# Altium footprint library pcb_ConnectorGeneral.PcbLib: 111 footprints (part 5 of 7)
Each footprint in its own frame and in the unit in brackets; x right, y up, seen from the top. Pads: shape width x height; smd on the part's side, far side on the other; paste and mask are expansions set on the pad; w line width, h text height; cw(c..) or ccw(c..) is an arc to the next point about the centre after c.
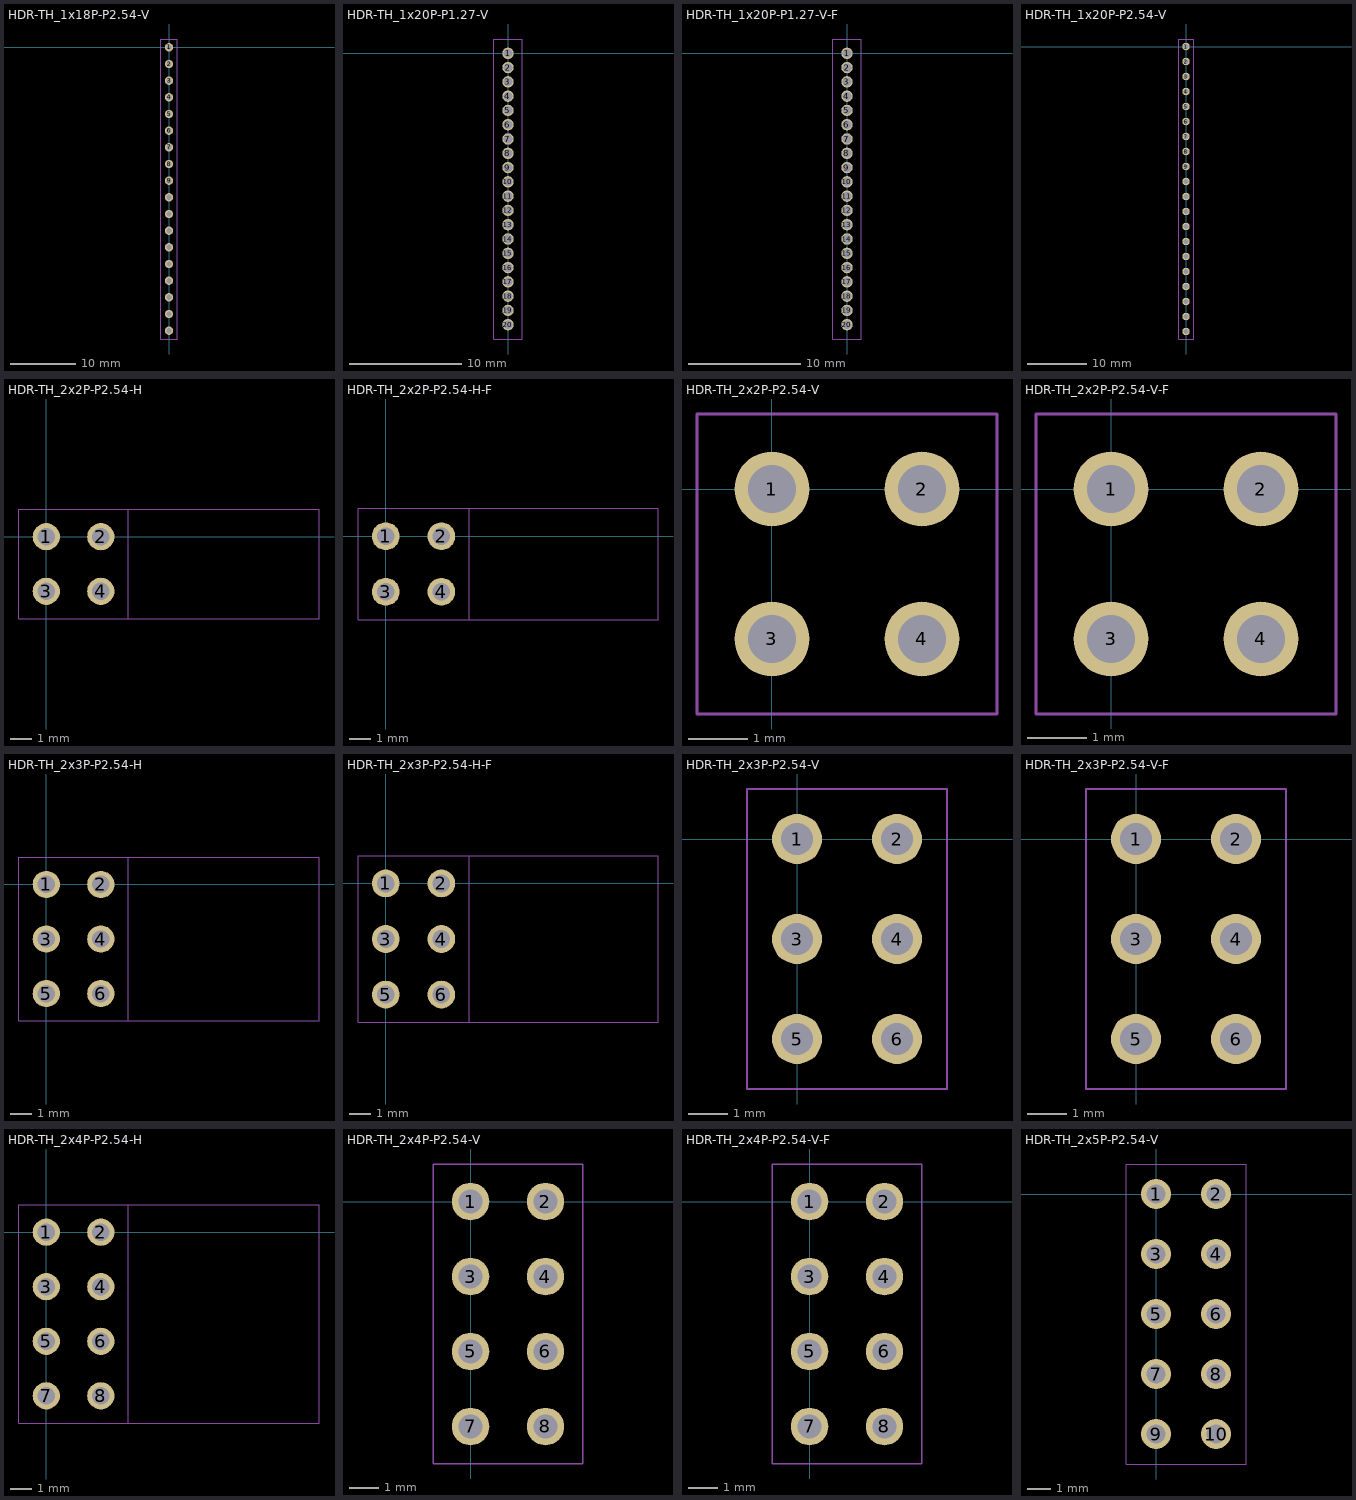
[diagram p4: the footprints below, top view; thin cyan lines are the x and y axes]

## HDR-TH_1x18P-P2.54-V [mil]
height 169.29
pads (18):
  round 50 hole 32: 1(0,0) 2(0,-100) 3(0,-200) 4(0,-300) 5(0,-400) 6(0,-500) 7(0,-600) 8(0,-700) 9(0,-800) 10(0,-900) 11(0,-1000) 12(0,-1100) 13(0,-1200) 14(0,-1300) 15(0,-1400) 16(0,-1500) 17(0,-1600) 18(0,-1700)
Mechanical 13:
  lines w2: -50,-1750 50,-1750 50,50 -50,50 -50,-1750
Mechanical 14:
  lines w2: -50,-1750 50,-1750 50,50 -50,50 -50,-1750
Mechanical 16:
  text ".Designator" at 0,0 h39.37
3D body "pin_header_aw140-eg-g18d.stp": height 322.83, standoff -118.11, extent -49.19,-1750 49.18,50

## HDR-TH_1x20P-P1.27-V [mil]
height 169.29
pads (20):
  round 40 hole 30: 1(0,0) 2(0,-50) 3(0,-100) 4(0,-150) 5(0,-200) 6(0,-250) 7(0,-300) 8(0,-350) 9(0,-400) 10(0,-450) 11(0,-500) 12(0,-550) 13(0,-600) 14(0,-650) 15(0,-700) 16(0,-750) 17(0,-800) 18(0,-850) 19(-0.01,-900) 20(-0.01,-950)
Mechanical 13:
  lines w2: -50,-1000 -50,50 50,50 50,-1000 -50,-1000
Mechanical 14:
  lines w2: -50,-1000 -50,50 50,50 50,-1000 -50,-1000
Mechanical 16:
  text ".Designator" at 0,0 h39.37
3D body "pin_header_a-sl127-eg-g20d.stp": height 210.24, standoff -102.36, extent -49.65,-975 48.77,25

## HDR-TH_1x20P-P1.27-V-F [mil]
height 169.29
pads (20):
  round 40 hole 30: 1(0,0) 2(0,-50) 3(0,-100) 4(0,-150) 5(0,-200) 6(0,-250) 7(0,-300) 8(0,-350) 9(0,-400) 10(0,-450) 11(0,-500) 12(0,-550) 13(0,-600) 14(0,-650) 15(0,-700) 16(0,-750) 17(0,-800) 18(0,-850) 19(-0.01,-900) 20(-0.01,-950)
Mechanical 13:
  lines w2: -50,-1000 -50,50 50,50 50,-1000 -50,-1000
Mechanical 14:
  lines w2: -50,-1000 -50,50 50,50 50,-1000 -50,-1000
Mechanical 16:
  text ".Designator" at 0,0 h39.37
3D body "female_header_a-bl127-eg-g20d.stp": height 133.86, standoff -94.49, extent -35.87,-982.87 34.99,32.88

## HDR-TH_1x20P-P2.54-V [mil]
height 169.29
pads (20):
  round 50 hole 32: 1(0,0) 2(0,-100) 3(0,-200) 4(0,-300) 5(0,-400) 6(0,-500) 7(0,-600) 8(0,-700) 9(0,-800) 10(0,-900) 11(0,-1000) 12(0,-1100) 13(0,-1200) 14(0,-1300) 15(0,-1400) 16(0,-1500) 17(0,-1600) 18(0,-1700) 19(0,-1800) 20(0,-1900)
Mechanical 13:
  lines w2: -50,-1950 50,-1950 50,50 -50,50 -50,-1950
Mechanical 14:
  lines w2: -50,-1950 50,-1950 50,50 -50,50 -50,-1950
Mechanical 16:
  text ".Designator" at 0,0 h39.37
3D body "pin_header_aw140-eg-g20d.stp": height 322.83, standoff -118.11, extent -49.31,-1951.06 49.05,48.94

## HDR-TH_2x2P-P2.54-H [mil]
height 169.29
pads (4):
  round 50 hole 32: 1(0,0) 2(100,0) 3(0,-100) 4(100,-100)
Mechanical 13:
  lines w2: -50,-150 -50,50 500,50 500,-150 -50,-150
Mechanical 14:
  lines w2: -50,-150 -50,50 150,50 150,-150 -50,-150
Mechanical 16:
  text ".Designator" at 0,0 h39.37
3D body "pin_header_awl254-da-g04d.stp": height 198.43, standoff -116.54, extent -10,-150 497.09,50

## HDR-TH_2x2P-P2.54-H-F [mil]
height 169.29
pads (4):
  round 50 hole 32: 1(0,0) 2(100,0) 3(0,-100) 4(100,-100)
Mechanical 13:
  lines w2: -50,-150 490,-150 490,50 -50,50 -50,-150
Mechanical 14:
  lines w2: -50,-150 -50,50 150,50 150,-150 -50,-150
Mechanical 16:
  text ".Designator" at 0,0 h39.37
3D body "female_header_a-bl254-da-g04d.stp": height 198.43, standoff -124.41, extent -10,-154.92 486.06,54.92

## HDR-TH_2x2P-P2.54-V [mil]
height 169.29
pads (4):
  round 50 hole 32: 1(0,0) 2(100,0) 3(0,-100) 4(100,-100)
Mechanical 13:
  lines w2: -50,-150 -50,50 150,50 150.01,-150 -50,-150
Mechanical 14:
  lines w2: -50,-150 150,-150 150,50 -50,50 -50,-150
Mechanical 16:
  text ".Designator" at 0,0 h39.37
3D body "pin_header_awl254-dg-g04d.stp": height 334.65, standoff -118.11, extent -50,-150 150,50

## HDR-TH_2x2P-P2.54-V-F [mil]
height 169.29
pads (4):
  round 50 hole 32: 1(0,0) 2(100,0) 3(0,-100) 4(100,-100)
Mechanical 13:
  lines w2: -50,-150 150,-150 150,50 -50,50 -50,-150
Mechanical 14:
  lines w2: -50,-150 -50,50 150,50 150,-150 -50,-150
Mechanical 16:
  text ".Designator" at 0,0 h39.37
3D body "female_header_a-bl254-dg-g04d.stp": height 334.65, standoff -125.98, extent -48.42,-154.92 148.43,54.92

## HDR-TH_2x3P-P2.54-H [mil]
height 169.29
pads (6):
  round 50 hole 32: 1(0,0) 2(100,0) 3(0,-100) 4(100,-100) 5(0,-200) 6(100,-200)
Mechanical 13:
  lines w2: -50,-250 500,-250 500,50 -50,50 -50,-250
Mechanical 14:
  lines w2: -50,-250 -50,50 150,50 150,-250 -50,-250
Mechanical 16:
  text ".Designator" at 0,0 h39.37
3D body "pin_header_awl254-da-g06d.stp": height 198.43, standoff -116.54, extent -10,-250 497.09,50

## HDR-TH_2x3P-P2.54-H-F [mil]
height 169.29
pads (6):
  round 50 hole 32: 1(0,0) 2(100,0) 3(0,-100) 4(100,-100) 5(0,-200) 6(100,-200)
Mechanical 13:
  lines w2: -50,-250 -50,50 490,50 490,-250 -50,-250
Mechanical 14:
  lines w2: -50,-250 -50,50 150,50 150,-250 -50,-250
Mechanical 16:
  text ".Designator" at 0,0 h39.37
3D body "female_header_a-bl254-da-g06d.stp": height 198.43, standoff -124.41, extent -10,-254.92 486.06,54.92

## HDR-TH_2x3P-P2.54-V [mil]
height 169.29
pads (6):
  round 50 hole 32: 1(0,0) 2(100,0) 3(0,-100) 4(100,-100) 5(0,-200) 6(100,-200)
Mechanical 13:
  lines w2: -50,-250 -50,50 150,50 150,-250 -50,-250
Mechanical 14:
  lines w2: -50,-250 -50,50 150,50 150,-250 -50,-250
Mechanical 16:
  text ".Designator" at 0,0 h39.37
3D body "pin_header_awl254-dg-g06d.stp": height 334.65, standoff -118.11, extent -50,-250 150,50

## HDR-TH_2x3P-P2.54-V-F [mil]
height 169.29
pads (6):
  round 50 hole 32: 1(0,0) 2(100,0) 3(0,-100) 4(100,-100) 5(0,-200) 6(100,-200)
Mechanical 13:
  lines w2: -50,-250 -50,50 150,50 150,-250 -50,-250
Mechanical 14:
  lines w2: -50,-250 -50,50 150,50 150,-250 -50,-250
Mechanical 16:
  text ".Designator" at 0,0 h39.37
3D body "female_header_a-bl254-dg-g06d.stp": height 334.65, standoff -125.98, extent -48.42,-254.92 148.43,54.92

## HDR-TH_2x4P-P2.54-H [mil]
height 169.29
pads (8):
  round 50 hole 32: 1(0,0) 2(100,0) 3(0,-100) 4(100,-100) 5(0,-200) 6(100,-200) 7(0,-300) 8(100,-300)
Mechanical 13:
  lines w2: -50,-350 -50,50 500,50 500,-350 -50,-350
Mechanical 14:
  lines w2: -50,-350 -50,50 150,50 150,-350 -50,-350
Mechanical 16:
  text ".Designator" at 0,0 h39.37
3D body "pin_header_awl254-da-g08d.stp": height 198.43, standoff -116.54, extent -12.44,-350 494.65,50

## HDR-TH_2x4P-P2.54-V [mil]
height 169.29
pads (8):
  round 50 hole 32: 1(0,0) 2(100,0) 3(0,-100) 4(100,-100) 5(0,-200) 6(100,-200) 7(0,-300) 8(100,-300)
Mechanical 13:
  lines w2: -50,-350 -50,50 150,50 150,-350 -50,-350
Mechanical 14:
  lines w2: -50,-350 -50,50 150,50 150,-350 -50,-350
Mechanical 16:
  text ".Designator" at 0,0 h39.37
3D body "pin_header_awl254-dg-g08d.stp": height 334.65, standoff -118.11, extent -50,-350 150,50

## HDR-TH_2x4P-P2.54-V-F [mil]
height 169.29
pads (8):
  round 50 hole 32: 1(0,0) 2(100,0) 3(0,-100) 4(100,-100) 5(0,-200) 6(100,-200) 7(0,-300) 8(100,-300)
Mechanical 13:
  lines w2: -50,-350 -50,50 150,50 150,-350 -50,-350
Mechanical 14:
  lines w2: -50,-350 -50,50 150,50 150,-350 -50,-350
Mechanical 16:
  text ".Designator" at 0,0 h39.37
3D body "female_header_a-bl254-dg-g08d.stp": height 334.65, standoff -125.98, extent -48.42,-354.92 148.43,54.92

## HDR-TH_2x5P-P2.54-V [mil]
height 169.29
pads (10):
  round 50 hole 32: 1(0,0) 2(100,0) 3(0,-100) 4(100,-100) 5(0,-200) 6(100,-200) 7(0,-300) 8(100,-300) 9(0,-400) 10(100,-400)
Mechanical 13:
  lines w2: -50,-450 -50,50 150,50 150,-450 -50,-450
Mechanical 14:
  lines w2: -50,-450 150,-450 150,50 -50,50 -50,-450
Mechanical 16:
  text ".Designator" at 0,0 h39.37
3D body "pin_header_awl254-dg-g10d.stp": height 334.65, standoff -118.11, extent -50,-450 150,50